# Altium footprint library Lib_001_rus.PcbLib: 38 footprints (part 3 of 3)
Each footprint in its own frame and in the unit in brackets; x right, y up, seen from the top. Pads: shape width x height; smd on the part's side, far side on the other; paste and mask are expansions set on the pad; w line width, h text height; cw(c..) or ccw(c..) is an arc to the next point about the centre after c.
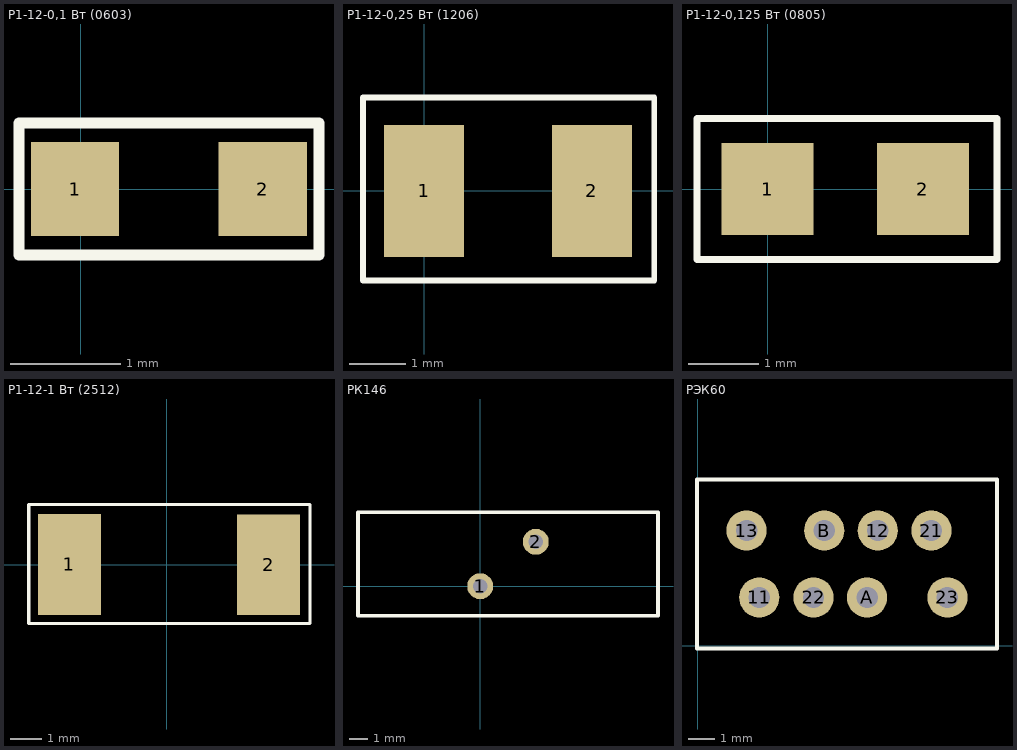
[diagram p2: the footprints below, top view; thin cyan lines are the x and y axes]

## Р1-12-0,1 Вт (0603) [mm]
pads (2):
  rect 0.8x0.85 smd: 1(-0.051,0) 2(1.651,0)
Top Overlay:
  lines w0.1: -0.559,-0.6 2.159,-0.6 2.159,0.6 -0.559,0.6 -0.559,-0.6
3D body: height 0.47, standoff 0, extent 1.35,-0.425 1.6,0.425
3D body: height 0.47, standoff 0, extent 0,-0.425 0.25,0.425
3D body: height 0.45, standoff 0, extent 0.25,-0.425 1.35,0.425

## Р1-12-0,25 Вт (1206) [mil]
height 78.74
pads (2):
  rect 56x92 smd: 1(0,0) 2(117,0)
Top Overlay:
  lines w3.94: -42.5,-62.5 -42.5,65 160.5,65 160.5,-11 160.5,-62.5 -42.5,-62.5
3D body: height 59.06, standoff 0, extent 0,-45.28 118.11,45.28
3D body: height 59.06, standoff 0, extent 118.11,-45.28 137.8,45.28
3D body: height 59.06, standoff 0, extent -19.68,-45.28 0,45.28

## Р1-12-0,125 Вт (0805) [mm]
height 0.5
pads (2):
  rect 1.3x1.3 smd: 1(0,0) 2(2.2,0)
Top Overlay:
  lines w0.1: -1,-1 -1,1 3.25,1 3.25,-1 -1,-1
3D body: height 1, standoff 0, extent 2.1,-0.65 2.6,0.65
3D body: height 1, standoff 0, extent -0.35,-0.65 0.1,0.65
3D body: height 1, standoff 0, extent 0.1,-0.65 2.1,0.65

## Р1-12-1 Вт (2512) [mm] "Chip Capacitor, Body 2.54x1.27mm, IPC High Density"
height 1.3
pads (2):
  rect 2x3.2 smd: 1(-3.09,0.01) 2(3.23,0)
Top Overlay:
  lines w0.1: -4.38,-1.86 4.54,-1.86 4.54,1.91 -4.38,1.91 -4.38,-1.86
3D body "User Library-res2512_body.STEP": height 0.62, standoff 0, extent -3.07,-1.6 3.25,1.6

## РК146 [mm]
pads (2):
  round 1.4 hole 0.8 unplated: 1(0,0) 2(3,2.4)
Top Overlay:
  lines w0.2: 0.45,-1.6 1.5,-1.6 ; 0.45,4 1.5,4 ; 1.5,-1.6 -6.6,-1.6 -6.6,4 1.5,4 ; 1.5,-1.6 9.6,-1.6 9.6,4 1.5,4
3D body: height 1, standoff -2, extent -0.248,-0.249 0.25,0.25
3D body: height 1, standoff -2, extent 2.752,2.151 3.25,2.65
3D body: height 3.4, standoff 0, extent -6.6,-1.6 9.6,4

## РЭК60 [mm]
pads (8):
  round 1.5 hole 0.8: 11(2.3,1.8) 12(6.725,4.3) 13(1.825,4.3) 21(8.725,4.3) 22(4.325,1.8) 23(9.325,1.8) A(6.325,1.8) B(4.725,4.3)
Top Overlay:
  lines w0.15: -0.025,-0.1 2.3,-0.1 11.175,-0.1 11.175,1.8 11.175,6.2 -0.025,6.2 -0.025,4.3 -0.025,-0.1
3D body "User Library-RES60.STEP": height 15.9, standoff -4, extent 0,0 11.1,6.1